# Altium schematic symbol library jlcpcb_2025_04_inductors_extended_0603.schlib: 1269 symbols (part 3 of 7) (continued)
## HSC0603-11NJ-T
designator L?  Inductance: 11nH
Inductor, 11nH, ±5%, 145mΩ, 700mA, SMD 0603; Manufacturer: EMTEK; Manufacturer Part Number: HSC0603-11NJ-T; Self-Resonant Frequency: 4GHz; Q Factor: 30@250MHz; Package Size: 0603; JLCPCB Basic Part: No; JLCPCB Part Number: C251765; Supplier 1: LCSC; Category: Inductors; Supplier Part Number 1: C251765; Tolerance: ±5%; Rated Current: 700mA; DC Resistance: 145mΩ; RoHS: Yes; ComponentLink1Description: Datasheet; ComponentLink1URL: https://wmsc.lcsc.com/wmsc/upload/file/pdf/v2/lcsc/2304140030_EMTEK-HSC0603-11NJ-T_C251765.pdf; ComponentLink2Description: JLCPCB Part URL; ComponentLink2URL: https://jlcpcb.com/partdetail/C251765; ComponentLink3Description: LCSC Part URL; ComponentLink3URL: https://lcsc.com/product-detail/Inductors-SMD_EMTEK-EMTEK-HSC0603-11NJ-T_C251765.html
footprint IND-0603 (0603 (1608M) Inductor)
pins: 1, 2

## HSC0603-16NJ-T
designator L?  Inductance: 16nH
Inductor, 16nH, ±5%, 170mΩ, 700mA, SMD 0603; Manufacturer: EMTEK; Manufacturer Part Number: HSC0603-16NJ-T; Self-Resonant Frequency: 3.3GHz; Q Factor: 34@250MHz; Package Size: 0603; JLCPCB Basic Part: No; JLCPCB Part Number: C251769; Supplier 1: LCSC; Category: Inductors; Supplier Part Number 1: C251769; Tolerance: ±5%; Rated Current: 700mA; DC Resistance: 170mΩ; RoHS: Yes; ComponentLink1Description: Datasheet; ComponentLink1URL: https://wmsc.lcsc.com/wmsc/upload/file/pdf/v2/lcsc/2304140030_EMTEK-HSC0603-16NJ-T_C251769.pdf; ComponentLink2Description: JLCPCB Part URL; ComponentLink2URL: https://jlcpcb.com/partdetail/C251769; ComponentLink3Description: LCSC Part URL; ComponentLink3URL: https://lcsc.com/product-detail/Inductors-SMD_EMTEK-EMTEK-HSC0603-16NJ-T_C251769.html
footprint IND-0603 (0603 (1608M) Inductor)
pins: 1, 2

## HSC0603-18NJ-T
designator L?  Inductance: 18nH
Inductor, 18nH, ±5%, 180mΩ, 700mA, SMD 0603; Manufacturer: EMTEK; Manufacturer Part Number: HSC0603-18NJ-T; Self-Resonant Frequency: 3.1GHz; Q Factor: 35@250MHz; Package Size: 0603; JLCPCB Basic Part: No; JLCPCB Part Number: C251770; Supplier 1: LCSC; Category: Inductors; Supplier Part Number 1: C251770; Tolerance: ±5%; Rated Current: 700mA; DC Resistance: 180mΩ; RoHS: Yes; ComponentLink1Description: Datasheet; ComponentLink1URL: https://wmsc.lcsc.com/wmsc/upload/file/pdf/v2/lcsc/2304140030_EMTEK-HSC0603-18NJ-T_C251770.pdf; ComponentLink2Description: JLCPCB Part URL; ComponentLink2URL: https://jlcpcb.com/partdetail/C251770; ComponentLink3Description: LCSC Part URL; ComponentLink3URL: https://lcsc.com/product-detail/Inductors-SMD_EMTEK-EMTEK-HSC0603-18NJ-T_C251770.html
footprint IND-0603 (0603 (1608M) Inductor)
pins: 1, 2

## HSC0603-20NJ-T
designator L?  Inductance: 20nH
Inductor, 20nH, ±5%, 190mΩ, 700mA, SMD 0603; Manufacturer: EMTEK; Manufacturer Part Number: HSC0603-20NJ-T; Self-Resonant Frequency: 3GHz; Q Factor: 38@250MHz; Package Size: 0603; JLCPCB Basic Part: No; JLCPCB Part Number: C251773; Supplier 1: LCSC; Category: Inductors; Supplier Part Number 1: C251773; Tolerance: ±5%; Rated Current: 700mA; DC Resistance: 190mΩ; RoHS: Yes; ComponentLink1Description: Datasheet; ComponentLink1URL: https://wmsc.lcsc.com/wmsc/upload/file/pdf/v2/lcsc/2304140030_EMTEK-HSC0603-20NJ-T_C251773.pdf; ComponentLink2Description: JLCPCB Part URL; ComponentLink2URL: https://jlcpcb.com/partdetail/C251773; ComponentLink3Description: LCSC Part URL; ComponentLink3URL: https://lcsc.com/product-detail/Inductors-SMD_EMTEK-EMTEK-HSC0603-20NJ-T_C251773.html
footprint IND-0603 (0603 (1608M) Inductor)
pins: 1, 2

## HSC0603-24NJ-T
designator L?  Inductance: 24nH
Inductor, 24nH, ±5%, 205mΩ, 700mA, SMD 0603; Manufacturer: EMTEK; Manufacturer Part Number: HSC0603-24NJ-T; Self-Resonant Frequency: 2.65GHz; Q Factor: 36@250MHz; Package Size: 0603; JLCPCB Basic Part: No; JLCPCB Part Number: C251775; Supplier 1: LCSC; Category: Inductors; Supplier Part Number 1: C251775; Tolerance: ±5%; Rated Current: 700mA; DC Resistance: 205mΩ; RoHS: Yes; ComponentLink1Description: Datasheet; ComponentLink1URL: https://wmsc.lcsc.com/wmsc/upload/file/pdf/v2/lcsc/2304140030_EMTEK-HSC0603-24NJ-T_C251775.pdf; ComponentLink2Description: JLCPCB Part URL; ComponentLink2URL: https://jlcpcb.com/partdetail/C251775; ComponentLink3Description: LCSC Part URL; ComponentLink3URL: https://lcsc.com/product-detail/Inductors-SMD_EMTEK-EMTEK-HSC0603-24NJ-T_C251775.html
footprint IND-0603 (0603 (1608M) Inductor)
pins: 1, 2

## HSC0603-27NJ-T
designator L?  Inductance: 27nH
Inductor, 27nH, ±5%, 220mΩ, 600mA, SMD 0603; Manufacturer: EMTEK; Manufacturer Part Number: HSC0603-27NJ-T; Self-Resonant Frequency: 2.8GHz; Q Factor: 40@250MHz; Package Size: 0603; JLCPCB Basic Part: No; JLCPCB Part Number: C251776; Supplier 1: LCSC; Category: Inductors; Supplier Part Number 1: C251776; Tolerance: ±5%; Rated Current: 600mA; DC Resistance: 220mΩ; RoHS: Yes; ComponentLink1Description: Datasheet; ComponentLink1URL: https://wmsc.lcsc.com/wmsc/upload/file/pdf/v2/lcsc/2304140030_EMTEK-HSC0603-27NJ-T_C251776.pdf; ComponentLink2Description: JLCPCB Part URL; ComponentLink2URL: https://jlcpcb.com/partdetail/C251776; ComponentLink3Description: LCSC Part URL; ComponentLink3URL: https://lcsc.com/product-detail/Inductors-SMD_EMTEK-EMTEK-HSC0603-27NJ-T_C251776.html
footprint IND-0603 (0603 (1608M) Inductor)
pins: 1, 2

## HSC0603-36NJ-T
designator L?  Inductance: 36nH
Inductor, 36nH, ±5%, 250mΩ, 600mA, SMD 0603; Manufacturer: EMTEK; Manufacturer Part Number: HSC0603-36NJ-T; Self-Resonant Frequency: 2.08GHz; Q Factor: 37@250MHz; Package Size: 0603; JLCPCB Basic Part: No; JLCPCB Part Number: C251780; Supplier 1: LCSC; Category: Inductors; Supplier Part Number 1: C251780; Tolerance: ±5%; Rated Current: 600mA; DC Resistance: 250mΩ; RoHS: Yes; ComponentLink1Description: Datasheet; ComponentLink1URL: https://wmsc.lcsc.com/wmsc/upload/file/pdf/v2/lcsc/2304140030_EMTEK-HSC0603-36NJ-T_C251780.pdf; ComponentLink2Description: JLCPCB Part URL; ComponentLink2URL: https://jlcpcb.com/partdetail/C251780; ComponentLink3Description: LCSC Part URL; ComponentLink3URL: https://lcsc.com/product-detail/Inductors-SMD_EMTEK-EMTEK-HSC0603-36NJ-T_C251780.html
footprint IND-0603 (0603 (1608M) Inductor)
pins: 1, 2

## HSC0603-39NJ-T
designator L?  Inductance: 39nH
Inductor, 39nH, ±5%, 260mΩ, 600mA, SMD 0603; Manufacturer: EMTEK; Manufacturer Part Number: HSC0603-39NJ-T; Self-Resonant Frequency: 2.2GHz; Q Factor: 40@250MHz; Package Size: 0603; JLCPCB Basic Part: No; JLCPCB Part Number: C251781; Supplier 1: LCSC; Category: Inductors; Supplier Part Number 1: C251781; Tolerance: ±5%; Rated Current: 600mA; DC Resistance: 260mΩ; RoHS: Yes; ComponentLink1Description: Datasheet; ComponentLink1URL: https://wmsc.lcsc.com/wmsc/upload/file/pdf/v2/lcsc/2304140030_EMTEK-HSC0603-39NJ-T_C251781.pdf; ComponentLink2Description: JLCPCB Part URL; ComponentLink2URL: https://jlcpcb.com/partdetail/C251781; ComponentLink3Description: LCSC Part URL; ComponentLink3URL: https://lcsc.com/product-detail/Inductors-SMD_EMTEK-EMTEK-HSC0603-39NJ-T_C251781.html
footprint IND-0603 (0603 (1608M) Inductor)
pins: 1, 2

## HSC0603-43NJ-T
designator L?  Inductance: 43nH
Inductor, 43nH, ±5%, 280mΩ, 600mA, SMD 0603; Manufacturer: EMTEK; Manufacturer Part Number: HSC0603-43NJ-T; Self-Resonant Frequency: 2GHz; Q Factor: 38@250MHz; Package Size: 0603; JLCPCB Basic Part: No; JLCPCB Part Number: C251785; Supplier 1: LCSC; Category: Inductors; Supplier Part Number 1: C251785; Tolerance: ±5%; Rated Current: 600mA; DC Resistance: 280mΩ; RoHS: Yes; ComponentLink1Description: Datasheet; ComponentLink1URL: https://wmsc.lcsc.com/wmsc/upload/file/pdf/v2/lcsc/2304140030_EMTEK-HSC0603-43NJ-T_C251785.pdf; ComponentLink2Description: JLCPCB Part URL; ComponentLink2URL: https://jlcpcb.com/partdetail/C251785; ComponentLink3Description: LCSC Part URL; ComponentLink3URL: https://lcsc.com/product-detail/Inductors-SMD_EMTEK-EMTEK-HSC0603-43NJ-T_C251785.html
footprint IND-0603 (0603 (1608M) Inductor)
pins: 1, 2

## HSC0603-51NJ-T
designator L?  Inductance: 51nH
Inductor, 51nH, ±5%, 300mΩ, 600mA, SMD 0603; Manufacturer: EMTEK; Manufacturer Part Number: HSC0603-51NJ-T; Self-Resonant Frequency: 2.13GHz; Q Factor: 38@250MHz; Package Size: 0603; JLCPCB Basic Part: No; JLCPCB Part Number: C251789; Supplier 1: LCSC; Category: Inductors; Supplier Part Number 1: C251789; Tolerance: ±5%; Rated Current: 600mA; DC Resistance: 300mΩ; RoHS: Yes; ComponentLink1Description: Datasheet; ComponentLink1URL: https://wmsc.lcsc.com/wmsc/upload/file/pdf/v2/lcsc/2304140030_EMTEK-HSC0603-51NJ-T_C251789.pdf; ComponentLink2Description: JLCPCB Part URL; ComponentLink2URL: https://jlcpcb.com/partdetail/C251789; ComponentLink3Description: LCSC Part URL; ComponentLink3URL: https://lcsc.com/product-detail/Inductors-SMD_EMTEK-EMTEK-HSC0603-51NJ-T_C251789.html
footprint IND-0603 (0603 (1608M) Inductor)
pins: 1, 2

## HSC0603-56NJ-T
designator L?  Inductance: 56nH
Inductor, 56nH, ±5%, 310mΩ, 600mA, SMD 0603; Manufacturer: EMTEK; Manufacturer Part Number: HSC0603-56NJ-T; Self-Resonant Frequency: 1.9GHz; Q Factor: 38@200MHz; Package Size: 0603; JLCPCB Basic Part: No; JLCPCB Part Number: C251790; Supplier 1: LCSC; Category: Inductors; Supplier Part Number 1: C251790; Tolerance: ±5%; Rated Current: 600mA; DC Resistance: 310mΩ; RoHS: Yes; ComponentLink1Description: Datasheet; ComponentLink1URL: https://wmsc.lcsc.com/wmsc/upload/file/pdf/v2/lcsc/2304140030_EMTEK-HSC0603-56NJ-T_C251790.pdf; ComponentLink2Description: JLCPCB Part URL; ComponentLink2URL: https://jlcpcb.com/partdetail/C251790; ComponentLink3Description: LCSC Part URL; ComponentLink3URL: https://lcsc.com/product-detail/Inductors-SMD_EMTEK-EMTEK-HSC0603-56NJ-T_C251790.html
footprint IND-0603 (0603 (1608M) Inductor)
pins: 1, 2

## HSC0603-72NJ-T
designator L?  Inductance: 72nH
Inductor, 72nH, ±5%, 490mΩ, 400mA, SMD 0603; Manufacturer: EMTEK; Manufacturer Part Number: HSC0603-72NJ-T; Self-Resonant Frequency: 1.7GHz; Q Factor: 34@150MHz; Package Size: 0603; JLCPCB Basic Part: No; JLCPCB Part Number: C251796; Supplier 1: LCSC; Category: Inductors; Supplier Part Number 1: C251796; Tolerance: ±5%; Rated Current: 400mA; DC Resistance: 490mΩ; RoHS: Yes; ComponentLink1Description: Datasheet; ComponentLink1URL: https://wmsc.lcsc.com/wmsc/upload/file/pdf/v2/lcsc/2304140030_EMTEK-HSC0603-72NJ-T_C251796.pdf; ComponentLink2Description: JLCPCB Part URL; ComponentLink2URL: https://jlcpcb.com/partdetail/C251796; ComponentLink3Description: LCSC Part URL; ComponentLink3URL: https://lcsc.com/product-detail/Inductors-SMD_EMTEK-EMTEK-HSC0603-72NJ-T_C251796.html
footprint IND-0603 (0603 (1608M) Inductor)
pins: 1, 2

## HSC0603-75NJ-T
designator L?  Inductance: 75nH
Inductor, 75nH, ±5%, 1A, SMD 0603; Manufacturer: EMTEK; Manufacturer Part Number: HSC0603-75NJ-T; Package Size: 0603; JLCPCB Basic Part: No; JLCPCB Part Number: C251797; Supplier 1: LCSC; Category: Inductors; Supplier Part Number 1: C251797; Tolerance: ±5%; Rated Current: 1A; RoHS: Yes; ComponentLink1Description: Datasheet; ComponentLink1URL: https://wmsc.lcsc.com/wmsc/upload/file/pdf/v2/lcsc/2304140030_EMTEK-HSC0603-75NJ-T_C251797.pdf; ComponentLink2Description: JLCPCB Part URL; ComponentLink2URL: https://jlcpcb.com/partdetail/C251797; ComponentLink3Description: LCSC Part URL; ComponentLink3URL: https://lcsc.com/product-detail/Inductors-SMD_EMTEK-EMTEK-HSC0603-75NJ-T_C251797.html
footprint IND-0603 (0603 (1608M) Inductor)
pins: 1, 2

## HSC0603-82NJ-T
designator L?  Inductance: 82nH
Inductor, 82nH, ±5%, 540mΩ, 400mA, SMD 0603; Manufacturer: EMTEK; Manufacturer Part Number: HSC0603-82NJ-T; Self-Resonant Frequency: 1.7GHz; Q Factor: 34@150MHz; Package Size: 0603; JLCPCB Basic Part: No; JLCPCB Part Number: C251799; Supplier 1: LCSC; Category: Inductors; Supplier Part Number 1: C251799; Tolerance: ±5%; Rated Current: 400mA; DC Resistance: 540mΩ; RoHS: Yes; ComponentLink1Description: Datasheet; ComponentLink1URL: https://wmsc.lcsc.com/wmsc/upload/file/pdf/v2/lcsc/2304140030_EMTEK-HSC0603-82NJ-T_C251799.pdf; ComponentLink2Description: JLCPCB Part URL; ComponentLink2URL: https://jlcpcb.com/partdetail/C251799; ComponentLink3Description: LCSC Part URL; ComponentLink3URL: https://lcsc.com/product-detail/Inductors-SMD_EMTEK-EMTEK-HSC0603-82NJ-T_C251799.html
footprint IND-0603 (0603 (1608M) Inductor)
pins: 1, 2

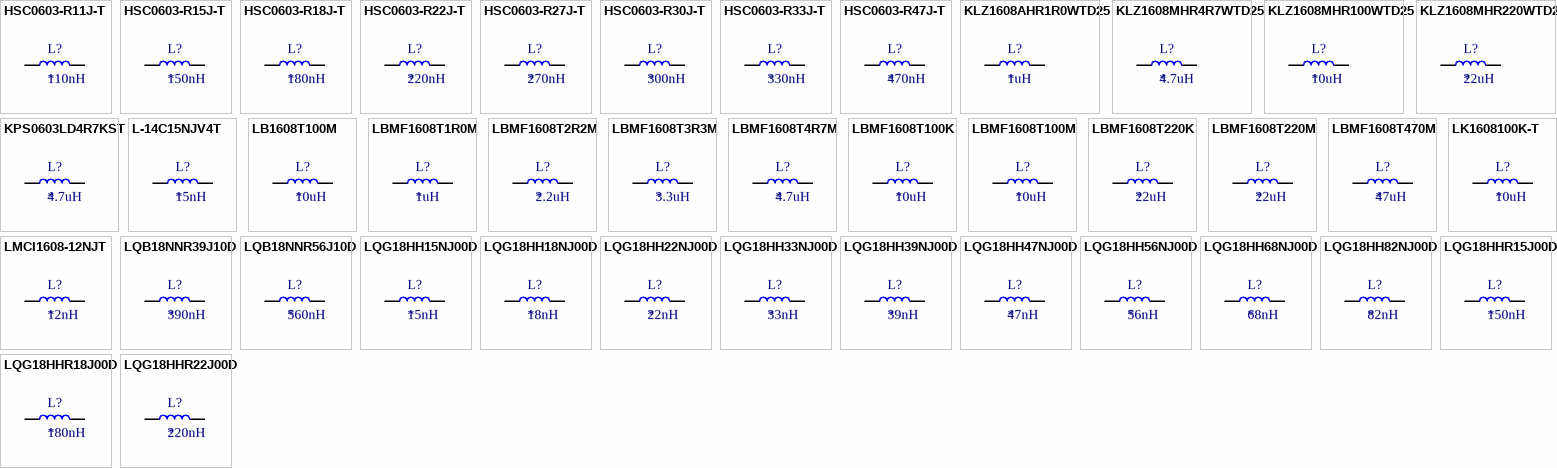
[diagram p11: symbols HSC0603-R11J-T to LQG18HHR22J00D]

## HSC0603-R11J-T
designator L?  Inductance: 110nH
Inductor, 110nH, ±5%, 610mΩ, 300mA, SMD 0603; Manufacturer: EMTEK; Manufacturer Part Number: HSC0603-R11J-T; Self-Resonant Frequency: 1.35GHz; Q Factor: 32@150MHz; Package Size: 0603; JLCPCB Basic Part: No; JLCPCB Part Number: C251805; Supplier 1: LCSC; Category: Inductors; Supplier Part Number 1: C251805; Tolerance: ±5%; Rated Current: 300mA; DC Resistance: 610mΩ; RoHS: Yes; ComponentLink1Description: Datasheet; ComponentLink1URL: https://wmsc.lcsc.com/wmsc/upload/file/pdf/v2/lcsc/2304140030_EMTEK-HSC0603-R11J-T_C251805.pdf; ComponentLink2Description: JLCPCB Part URL; ComponentLink2URL: https://jlcpcb.com/partdetail/C251805; ComponentLink3Description: LCSC Part URL; ComponentLink3URL: https://lcsc.com/product-detail/Inductors-SMD_EMTEK-EMTEK-HSC0603-R11J-T_C251805.html
footprint IND-0603 (0603 (1608M) Inductor)
pins: 1, 2

## HSC0603-R15J-T
designator L?  Inductance: 150nH
Inductor, 150nH, ±5%, 920mΩ, 280mA, SMD 0603; Manufacturer: EMTEK; Manufacturer Part Number: HSC0603-R15J-T; Self-Resonant Frequency: 990MHz; Q Factor: 28@150MHz; Package Size: 0603; JLCPCB Basic Part: No; JLCPCB Part Number: C251807; Supplier 1: LCSC; Category: Inductors; Supplier Part Number 1: C251807; Tolerance: ±5%; Rated Current: 280mA; DC Resistance: 920mΩ; RoHS: Yes; ComponentLink1Description: Datasheet; ComponentLink1URL: https://wmsc.lcsc.com/wmsc/upload/file/pdf/v2/lcsc/2304140030_EMTEK-HSC0603-R15J-T_C251807.pdf; ComponentLink2Description: JLCPCB Part URL; ComponentLink2URL: https://jlcpcb.com/partdetail/C251807; ComponentLink3Description: LCSC Part URL; ComponentLink3URL: https://lcsc.com/product-detail/Inductors-SMD_EMTEK-EMTEK-HSC0603-R15J-T_C251807.html
footprint IND-0603 (0603 (1608M) Inductor)
pins: 1, 2

## HSC0603-R18J-T
designator L?  Inductance: 180nH
Inductor, 180nH, ±5%, 1.25Ω, 240mA, SMD 0603; Manufacturer: EMTEK; Manufacturer Part Number: HSC0603-R18J-T; Self-Resonant Frequency: 990MHz; Q Factor: 25@100MHz; Package Size: 0603; JLCPCB Basic Part: No; JLCPCB Part Number: C251808; Supplier 1: LCSC; Category: Inductors; Supplier Part Number 1: C251808; Tolerance: ±5%; Rated Current: 240mA; DC Resistance: 1.25Ω; RoHS: Yes; ComponentLink1Description: Datasheet; ComponentLink1URL: https://wmsc.lcsc.com/wmsc/upload/file/pdf/v2/lcsc/2304140030_EMTEK-HSC0603-R18J-T_C251808.pdf; ComponentLink2Description: JLCPCB Part URL; ComponentLink2URL: https://jlcpcb.com/partdetail/C251808; ComponentLink3Description: LCSC Part URL; ComponentLink3URL: https://lcsc.com/product-detail/Inductors-SMD_EMTEK-EMTEK-HSC0603-R18J-T_C251808.html
footprint IND-0603 (0603 (1608M) Inductor)
pins: 1, 2

## HSC0603-R22J-T
designator L?  Inductance: 220nH
Inductor, 220nH, ±5%, 1.6Ω, 250mA, SMD 0603; Manufacturer: EMTEK; Manufacturer Part Number: HSC0603-R22J-T; Self-Resonant Frequency: 900MHz; Q Factor: 25@100MHz; Package Size: 0603; JLCPCB Basic Part: No; JLCPCB Part Number: C251809; Supplier 1: LCSC; Category: Inductors; Supplier Part Number 1: C251809; Tolerance: ±5%; Rated Current: 250mA; DC Resistance: 1.6Ω; RoHS: Yes; ComponentLink1Description: Datasheet; ComponentLink1URL: https://wmsc.lcsc.com/wmsc/upload/file/pdf/v2/lcsc/2304140030_EMTEK-HSC0603-R22J-T_C251809.pdf; ComponentLink2Description: JLCPCB Part URL; ComponentLink2URL: https://jlcpcb.com/partdetail/C251809; ComponentLink3Description: LCSC Part URL; ComponentLink3URL: https://lcsc.com/product-detail/Inductors-SMD_EMTEK-EMTEK-HSC0603-R22J-T_C251809.html
footprint IND-0603 (0603 (1608M) Inductor)
pins: 1, 2

## HSC0603-R27J-T
designator L?  Inductance: 270nH
Inductor, 270nH, ±5%, 2Ω, 170mA, SMD 0603; Manufacturer: EMTEK; Manufacturer Part Number: HSC0603-R27J-T; Self-Resonant Frequency: 900MHz; Q Factor: 24@100MHz; Package Size: 0603; JLCPCB Basic Part: No; JLCPCB Part Number: C251811; Supplier 1: LCSC; Category: Inductors; Supplier Part Number 1: C251811; Tolerance: ±5%; Rated Current: 170mA; DC Resistance: 2Ω; RoHS: Yes; ComponentLink1Description: Datasheet; ComponentLink1URL: https://wmsc.lcsc.com/wmsc/upload/file/pdf/v2/lcsc/2304140030_EMTEK-HSC0603-R27J-T_C251811.pdf; ComponentLink2Description: JLCPCB Part URL; ComponentLink2URL: https://jlcpcb.com/partdetail/C251811; ComponentLink3Description: LCSC Part URL; ComponentLink3URL: https://lcsc.com/product-detail/Inductors-SMD_EMTEK-EMTEK-HSC0603-R27J-T_C251811.html
footprint IND-0603 (0603 (1608M) Inductor)
pins: 1, 2

## HSC0603-R30J-T
designator L?  Inductance: 300nH
Inductor, 300nH, ±5%, 150mA, SMD 0603; Manufacturer: EMTEK; Manufacturer Part Number: HSC0603-R30J-T; Package Size: 0603; JLCPCB Basic Part: No; JLCPCB Part Number: C251812; Supplier 1: LCSC; Category: Inductors; Supplier Part Number 1: C251812; Tolerance: ±5%; Rated Current: 150mA; RoHS: Yes; ComponentLink1Description: Datasheet; ComponentLink1URL: https://wmsc.lcsc.com/wmsc/upload/file/pdf/v2/lcsc/1809301219_EMTEK-HSC0603-R30J-T_C251812.pdf; ComponentLink2Description: JLCPCB Part URL; ComponentLink2URL: https://jlcpcb.com/partdetail/C251812; ComponentLink3Description: LCSC Part URL; ComponentLink3URL: https://lcsc.com/product-detail/Inductors-SMD_EMTEK-EMTEK-HSC0603-R30J-T_C251812.html
footprint IND-0603 (0603 (1608M) Inductor)
pins: 1, 2

## HSC0603-R33J-T
designator L?  Inductance: 330nH
Inductor, 330nH, ±5%, 2.75Ω, 100mA, SMD 0603; Manufacturer: EMTEK; Manufacturer Part Number: HSC0603-R33J-T; Self-Resonant Frequency: 900MHz; Q Factor: 25@100MHz; Package Size: 0603; JLCPCB Basic Part: No; JLCPCB Part Number: C251813; Supplier 1: LCSC; Category: Inductors; Supplier Part Number 1: C251813; Tolerance: ±5%; Rated Current: 100mA; DC Resistance: 2.75Ω; RoHS: Yes; ComponentLink1Description: Datasheet; ComponentLink1URL: https://wmsc.lcsc.com/wmsc/upload/file/pdf/v2/lcsc/2304140030_EMTEK-HSC0603-R33J-T_C251813.pdf; ComponentLink2Description: JLCPCB Part URL; ComponentLink2URL: https://jlcpcb.com/partdetail/C251813; ComponentLink3Description: LCSC Part URL; ComponentLink3URL: https://lcsc.com/product-detail/Inductors-SMD_EMTEK-EMTEK-HSC0603-R33J-T_C251813.html
footprint IND-0603 (0603 (1608M) Inductor)
pins: 1, 2

## HSC0603-R47J-T
designator L?  Inductance: 470nH
Inductor, 470nH, ±5%, 4Ω, 80mA, SMD 0603; Manufacturer: EMTEK; Manufacturer Part Number: HSC0603-R47J-T; Self-Resonant Frequency: 750MHz; Q Factor: 25@100MHz; Package Size: 0603; JLCPCB Basic Part: No; JLCPCB Part Number: C251815; Supplier 1: LCSC; Category: Inductors; Supplier Part Number 1: C251815; Tolerance: ±5%; Rated Current: 80mA; DC Resistance: 4Ω; RoHS: Yes; ComponentLink1Description: Datasheet; ComponentLink1URL: https://wmsc.lcsc.com/wmsc/upload/file/pdf/v2/lcsc/1809301219_EMTEK-HSC0603-R47J-T_C251815.pdf; ComponentLink2Description: JLCPCB Part URL; ComponentLink2URL: https://jlcpcb.com/partdetail/C251815; ComponentLink3Description: LCSC Part URL; ComponentLink3URL: https://lcsc.com/product-detail/Inductors-SMD_EMTEK-EMTEK-HSC0603-R47J-T_C251815.html
footprint IND-0603 (0603 (1608M) Inductor)
pins: 1, 2

## KLZ1608AHR1R0WTD25
designator L?  Inductance: 1uH
Inductor, 1uH, ±20%, 150mΩ, 190mA, SMD 0603; Manufacturer: TDK; Manufacturer Part Number: KLZ1608AHR1R0WTD25; Package Size: 0603; JLCPCB Basic Part: No; JLCPCB Part Number: C404379; Supplier 1: LCSC; Category: Inductors; Supplier Part Number 1: C404379; Tolerance: ±20%; Rated Current: 190mA; Saturation Current: 190mA; DC Resistance: 150mΩ; RoHS: Yes; ComponentLink1Description: Datasheet; ComponentLink1URL: https://wmsc.lcsc.com/wmsc/upload/file/pdf/v2/lcsc/2304140030_TDK-KLZ1608AHR1R0WTD25_C404379.pdf; ComponentLink2Description: JLCPCB Part URL; ComponentLink2URL: https://jlcpcb.com/partdetail/C404379; ComponentLink3Description: LCSC Part URL; ComponentLink3URL: https://lcsc.com/product-detail/Inductors-SMD_TDK-TDK-KLZ1608AHR1R0WTD25_C404379.html
footprint IND-0603 (0603 (1608M) Inductor)
pins: 1, 2

## KLZ1608MHR4R7WTD25
designator L?  Inductance: 4.7uH
Inductor, 4.7uH, ±20%, 650mΩ, 350mA, SMD 0603; Manufacturer: TDK; Manufacturer Part Number: KLZ1608MHR4R7WTD25; Saturation Current: 120mA; Package Size: 0603; JLCPCB Basic Part: No; JLCPCB Part Number: C2042012; Supplier 1: LCSC; Category: Inductors; Supplier Part Number 1: C2042012; Tolerance: ±20%; Rated Current: 350mA; DC Resistance: 650mΩ; RoHS: Yes; ComponentLink1Description: Datasheet; ComponentLink1URL: https://wmsc.lcsc.com/wmsc/upload/file/pdf/v2/lcsc/2202010000_TDK-KLZ1608MHR4R7WTD25_C2042012.pdf; ComponentLink2Description: JLCPCB Part URL; ComponentLink2URL: https://jlcpcb.com/partdetail/C2042012; ComponentLink3Description: LCSC Part URL; ComponentLink3URL: https://lcsc.com/product-detail/Inductors-SMD_TDK-TDK-KLZ1608MHR4R7WTD25_C2042012.html
footprint IND-0603 (0603 (1608M) Inductor)
pins: 1, 2

## KLZ1608MHR100WTD25
designator L?  Inductance: 10uH
Inductor, 10uH, ±20%, 1.365Ω, SMD 0603; Manufacturer: TDK; Manufacturer Part Number: KLZ1608MHR100WTD25; Saturation Current: 90mA; Package Size: 0603; JLCPCB Basic Part: No; JLCPCB Part Number: C2041650; Supplier 1: LCSC; Category: Inductors; Supplier Part Number 1: C2041650; Tolerance: ±20%; DC Resistance: 1.365Ω; RoHS: Yes; ComponentLink1Description: Datasheet; ComponentLink1URL: https://wmsc.lcsc.com/wmsc/upload/file/pdf/v2/lcsc/2304140030_TDK-KLZ1608MHR100WTD25_C2041650.pdf; ComponentLink2Description: JLCPCB Part URL; ComponentLink2URL: https://jlcpcb.com/partdetail/C2041650; ComponentLink3Description: LCSC Part URL; ComponentLink3URL: https://lcsc.com/product-detail/Inductors-SMD_TDK-TDK-KLZ1608MHR100WTD25_C2041650.html
footprint IND-0603 (0603 (1608M) Inductor)
pins: 1, 2

## KLZ1608MHR220WTD25
designator L?  Inductance: 22uH
Inductor, 22uH, ±20%, 3.12Ω, SMD 0603; Manufacturer: TDK; Manufacturer Part Number: KLZ1608MHR220WTD25; Saturation Current: 55mA; Package Size: 0603; JLCPCB Basic Part: No; JLCPCB Part Number: C2041591; Supplier 1: LCSC; Category: Inductors; Supplier Part Number 1: C2041591; Tolerance: ±20%; DC Resistance: 3.12Ω; RoHS: Yes; ComponentLink1Description: Datasheet; ComponentLink1URL: https://wmsc.lcsc.com/wmsc/upload/file/pdf/v2/lcsc/2304140030_TDK-KLZ1608MHR220WTD25_C2041591.pdf; ComponentLink2Description: JLCPCB Part URL; ComponentLink2URL: https://jlcpcb.com/partdetail/C2041591; ComponentLink3Description: LCSC Part URL; ComponentLink3URL: https://lcsc.com/product-detail/Inductors-SMD_TDK-TDK-KLZ1608MHR220WTD25_C2041591.html
footprint IND-0603 (0603 (1608M) Inductor)
pins: 1, 2

## KPS0603LD4R7KST
designator L?  Inductance: 4.7uH
Inductor, 4.7uH, ±10%, 1.26Ω, 400mA, SMD 0603; Manufacturer: Yanchuang; Manufacturer Part Number: KPS0603LD4R7KST; Package Size: 0603; JLCPCB Basic Part: No; JLCPCB Part Number: C494717; Supplier 1: LCSC; Category: Inductors; Supplier Part Number 1: C494717; Tolerance: ±10%; Rated Current: 400mA; DC Resistance: 1.26Ω; RoHS: Yes; ComponentLink1Description: Datasheet; ComponentLink1URL: https://wmsc.lcsc.com/wmsc/upload/file/pdf/v2/lcsc/2004071209_Yanchuang-KPS0603LD4R7KST_C494717.pdf; ComponentLink2Description: JLCPCB Part URL; ComponentLink2URL: https://jlcpcb.com/partdetail/C494717; ComponentLink3Description: LCSC Part URL; ComponentLink3URL: https://lcsc.com/product-detail/Inductors-SMD_Yanchuang-Yanchuang-KPS0603LD4R7KST_C494717.html
footprint IND-0603 (0603 (1608M) Inductor)
pins: 1, 2

## L-14C15NJV4T
designator L?  Inductance: 15nH
Inductor, 15nH, ±5%, 550mΩ, 300mA, SMD 0603; Manufacturer: Johanson Dielectrics; Manufacturer Part Number: L-14C15NJV4T; Self-Resonant Frequency: 23GHz; Q Factor: 12@100MHz; Package Size: 0603; JLCPCB Basic Part: No; JLCPCB Part Number: C2041452; Supplier 1: LCSC; Category: Inductors; Supplier Part Number 1: C2041452; Tolerance: ±5%; Rated Current: 300mA; DC Resistance: 550mΩ; RoHS: Yes; ComponentLink1Description: Datasheet; ComponentLink1URL: https://wmsc.lcsc.com/wmsc/upload/file/pdf/v2/lcsc/2304140030_Johanson-Dielectrics-L-14C15NJV4T_C2041452.pdf; ComponentLink2Description: JLCPCB Part URL; ComponentLink2URL: https://jlcpcb.com/partdetail/C2041452; ComponentLink3Description: LCSC Part URL; ComponentLink3URL: https://lcsc.com/product-detail/Inductors-SMD_Johanson-Dielectrics-Johanson-Dielectrics-L-14C15NJV4T_C2041452.html
footprint IND-0603 (0603 (1608M) Inductor)
pins: 1, 2

## LB1608T100M
designator L?  Inductance: 10uH
Inductor, 10uH, ±20%, 700mΩ, 60mA, SMD 0603; Manufacturer: Taiyo Yuden; Manufacturer Part Number: LB1608T100M; Self-Resonant Frequency: 2.52MHz; Package Size: 0603; JLCPCB Basic Part: No; JLCPCB Part Number: C223240; Supplier 1: LCSC; Category: Inductors; Supplier Part Number 1: C223240; Tolerance: ±20%; Rated Current: 60mA; DC Resistance: 700mΩ; RoHS: Yes; ComponentLink1Description: Datasheet; ComponentLink1URL: https://wmsc.lcsc.com/wmsc/upload/file/pdf/v2/lcsc/2304140030_Taiyo-Yuden-LB1608T100M_C223240.pdf; ComponentLink2Description: JLCPCB Part URL; ComponentLink2URL: https://jlcpcb.com/partdetail/C223240; ComponentLink3Description: LCSC Part URL; ComponentLink3URL: https://lcsc.com/product-detail/Inductors-SMD_Taiyo-Yuden-Taiyo-Yuden-LB1608T100M_C223240.html
footprint IND-0603 (0603 (1608M) Inductor)
pins: 1, 2

## LBMF1608T1R0M
designator L?  Inductance: 1uH
Inductor, 1uH, ±20%, 90mΩ, 230mA, SMD 0603; Manufacturer: Taiyo Yuden; Manufacturer Part Number: LBMF1608T1R0M; Self-Resonant Frequency: 7.96MHz; Package Size: 0603; JLCPCB Basic Part: No; JLCPCB Part Number: C90325; Supplier 1: LCSC; Category: Inductors; Supplier Part Number 1: C90325; Tolerance: ±20%; Rated Current: 230mA; DC Resistance: 90mΩ; RoHS: Yes; ComponentLink1Description: Datasheet; ComponentLink1URL: https://wmsc.lcsc.com/wmsc/upload/file/pdf/v2/lcsc/2304140030_Taiyo-Yuden-LBMF1608T1R0M_C90325.pdf; ComponentLink2Description: JLCPCB Part URL; ComponentLink2URL: https://jlcpcb.com/partdetail/C90325; ComponentLink3Description: LCSC Part URL; ComponentLink3URL: https://lcsc.com/product-detail/Inductors-SMD_Taiyo-Yuden-Taiyo-Yuden-LBMF1608T1R0M_C90325.html
footprint IND-0603 (0603 (1608M) Inductor)
pins: 1, 2

## LBMF1608T2R2M
designator L?  Inductance: 2.2uH
Inductor, 2.2uH, ±20%, 170mΩ, 160mA, SMD 0603; Manufacturer: Taiyo Yuden; Manufacturer Part Number: LBMF1608T2R2M; Package Size: 0603; JLCPCB Basic Part: No; JLCPCB Part Number: C90326; Supplier 1: LCSC; Category: Inductors; Supplier Part Number 1: C90326; Tolerance: ±20%; Rated Current: 160mA; DC Resistance: 170mΩ; RoHS: Yes; ComponentLink1Description: Datasheet; ComponentLink1URL: https://wmsc.lcsc.com/wmsc/upload/file/pdf/v2/lcsc/2304140030_Taiyo-Yuden-LBMF1608T2R2M_C90326.pdf; ComponentLink2Description: JLCPCB Part URL; ComponentLink2URL: https://jlcpcb.com/partdetail/C90326; ComponentLink3Description: LCSC Part URL; ComponentLink3URL: https://lcsc.com/product-detail/Inductors-SMD_Taiyo-Yuden-Taiyo-Yuden-LBMF1608T2R2M_C90326.html
footprint IND-0603 (0603 (1608M) Inductor)
pins: 1, 2

## LBMF1608T3R3M
designator L?  Inductance: 3.3uH
Inductor, 3.3uH, ±20%, 220mΩ, 130mA, SMD 0603; Manufacturer: Taiyo Yuden; Manufacturer Part Number: LBMF1608T3R3M; Package Size: 0603; JLCPCB Basic Part: No; JLCPCB Part Number: C223241; Supplier 1: LCSC; Category: Inductors; Supplier Part Number 1: C223241; Tolerance: ±20%; Rated Current: 130mA; DC Resistance: 220mΩ; RoHS: Yes; ComponentLink1Description: Datasheet; ComponentLink1URL: https://wmsc.lcsc.com/wmsc/upload/file/pdf/v2/lcsc/2304140030_Taiyo-Yuden-LBMF1608T3R3M_C223241.pdf; ComponentLink2Description: JLCPCB Part URL; ComponentLink2URL: https://jlcpcb.com/partdetail/C223241; ComponentLink3Description: LCSC Part URL; ComponentLink3URL: https://lcsc.com/product-detail/Inductors-SMD_Taiyo-Yuden-Taiyo-Yuden-LBMF1608T3R3M_C223241.html
footprint IND-0603 (0603 (1608M) Inductor)
pins: 1, 2

## LBMF1608T4R7M
designator L?  Inductance: 4.7uH
Inductor, 4.7uH, ±20%, 240mΩ, 110mA, SMD 0603; Manufacturer: Taiyo Yuden; Manufacturer Part Number: LBMF1608T4R7M; Self-Resonant Frequency: 7.96MHz; Package Size: 0603; JLCPCB Basic Part: No; JLCPCB Part Number: C90327; Supplier 1: LCSC; Category: Inductors; Supplier Part Number 1: C90327; Tolerance: ±20%; Rated Current: 110mA; DC Resistance: 240mΩ; RoHS: Yes; ComponentLink1Description: Datasheet; ComponentLink1URL: https://wmsc.lcsc.com/wmsc/upload/file/pdf/v2/lcsc/2304140030_Taiyo-Yuden-LBMF1608T4R7M_C90327.pdf; ComponentLink2Description: JLCPCB Part URL; ComponentLink2URL: https://jlcpcb.com/partdetail/C90327; ComponentLink3Description: LCSC Part URL; ComponentLink3URL: https://lcsc.com/product-detail/Inductors-SMD_Taiyo-Yuden-Taiyo-Yuden-LBMF1608T4R7M_C90327.html
footprint IND-0603 (0603 (1608M) Inductor)
pins: 1, 2

## LBMF1608T100K
designator L?  Inductance: 10uH
Inductor, 10uH, ±10%, 360mΩ, 80mA, SMD 0603; Manufacturer: Taiyo Yuden; Manufacturer Part Number: LBMF1608T100K; Self-Resonant Frequency: 2.52MHz; Package Size: 0603; JLCPCB Basic Part: No; JLCPCB Part Number: C87216; Supplier 1: LCSC; Category: Inductors; Supplier Part Number 1: C87216; Tolerance: ±10%; Rated Current: 80mA; DC Resistance: 360mΩ; RoHS: Yes; ComponentLink1Description: Datasheet; ComponentLink1URL: https://wmsc.lcsc.com/wmsc/upload/file/pdf/v2/lcsc/1811071031_Taiyo-Yuden-LBMF1608T100K_C87216.pdf; ComponentLink2Description: JLCPCB Part URL; ComponentLink2URL: https://jlcpcb.com/partdetail/C87216; ComponentLink3Description: LCSC Part URL; ComponentLink3URL: https://lcsc.com/product-detail/Inductors-SMD_Taiyo-Yuden-Taiyo-Yuden-LBMF1608T100K_C87216.html
footprint IND-0603 (0603 (1608M) Inductor)
pins: 1, 2

## LBMF1608T100M
designator L?  Inductance: 10uH
Inductor, 10uH, ±20%, 360mΩ, 80mA, SMD 0603; Manufacturer: Taiyo Yuden; Manufacturer Part Number: LBMF1608T100M; Package Size: 0603; JLCPCB Basic Part: No; JLCPCB Part Number: C86752; Supplier 1: LCSC; Category: Inductors; Supplier Part Number 1: C86752; Tolerance: ±20%; Rated Current: 80mA; DC Resistance: 360mΩ; RoHS: Yes; ComponentLink1Description: Datasheet; ComponentLink1URL: https://wmsc.lcsc.com/wmsc/upload/file/pdf/v2/lcsc/1810091433_Taiyo-Yuden-LBMF1608T100M_C86752.pdf; ComponentLink2Description: JLCPCB Part URL; ComponentLink2URL: https://jlcpcb.com/partdetail/C86752; ComponentLink3Description: LCSC Part URL; ComponentLink3URL: https://lcsc.com/product-detail/Inductors-SMD_Taiyo-Yuden-Taiyo-Yuden-LBMF1608T100M_C86752.html
footprint IND-0603 (0603 (1608M) Inductor)
pins: 1, 2

## LBMF1608T220K
designator L?  Inductance: 22uH
Inductor, 22uH, ±10%, 1Ω, 50mA, SMD 0603; Manufacturer: Taiyo Yuden; Manufacturer Part Number: LBMF1608T220K; Self-Resonant Frequency: 2.52MHz; Package Size: 0603; JLCPCB Basic Part: No; JLCPCB Part Number: C223243; Supplier 1: LCSC; Category: Inductors; Supplier Part Number 1: C223243; Tolerance: ±10%; Rated Current: 50mA; DC Resistance: 1Ω; RoHS: Yes; ComponentLink1Description: Datasheet; ComponentLink1URL: https://wmsc.lcsc.com/wmsc/upload/file/pdf/v2/lcsc/2304140030_Taiyo-Yuden-LBMF1608T220K_C223243.pdf; ComponentLink2Description: JLCPCB Part URL; ComponentLink2URL: https://jlcpcb.com/partdetail/C223243; ComponentLink3Description: LCSC Part URL; ComponentLink3URL: https://lcsc.com/product-detail/Inductors-SMD_Taiyo-Yuden-Taiyo-Yuden-LBMF1608T220K_C223243.html
footprint IND-0603 (0603 (1608M) Inductor)
pins: 1, 2

## LBMF1608T220M
designator L?  Inductance: 22uH
Inductor, 22uH, ±20%, 1Ω, 50mA, SMD 0603; Manufacturer: Taiyo Yuden; Manufacturer Part Number: LBMF1608T220M; Package Size: 0603; JLCPCB Basic Part: No; JLCPCB Part Number: C223242; Supplier 1: LCSC; Category: Inductors; Supplier Part Number 1: C223242; Tolerance: ±20%; Rated Current: 50mA; DC Resistance: 1Ω; RoHS: Yes; ComponentLink1Description: Datasheet; ComponentLink1URL: https://wmsc.lcsc.com/wmsc/upload/file/pdf/v2/lcsc/2304140030_Taiyo-Yuden-LBMF1608T220M_C223242.pdf; ComponentLink2Description: JLCPCB Part URL; ComponentLink2URL: https://jlcpcb.com/partdetail/C223242; ComponentLink3Description: LCSC Part URL; ComponentLink3URL: https://lcsc.com/product-detail/Inductors-SMD_Taiyo-Yuden-Taiyo-Yuden-LBMF1608T220M_C223242.html
footprint IND-0603 (0603 (1608M) Inductor)
pins: 1, 2

## LBMF1608T470M
designator L?  Inductance: 47uH
Inductor, 47uH, ±20%, 2.5Ω, 35mA, SMD 0603; Manufacturer: Taiyo Yuden; Manufacturer Part Number: LBMF1608T470M; Package Size: 0603; JLCPCB Basic Part: No; JLCPCB Part Number: C223244; Supplier 1: LCSC; Category: Inductors; Supplier Part Number 1: C223244; Tolerance: ±20%; Rated Current: 35mA; DC Resistance: 2.5Ω; RoHS: Yes; ComponentLink1Description: Datasheet; ComponentLink1URL: https://wmsc.lcsc.com/wmsc/upload/file/pdf/v2/lcsc/2304140030_Taiyo-Yuden-LBMF1608T470M_C223244.pdf; ComponentLink2Description: JLCPCB Part URL; ComponentLink2URL: https://jlcpcb.com/partdetail/C223244; ComponentLink3Description: LCSC Part URL; ComponentLink3URL: https://lcsc.com/product-detail/Inductors-SMD_Taiyo-Yuden-Taiyo-Yuden-LBMF1608T470M_C223244.html
footprint IND-0603 (0603 (1608M) Inductor)
pins: 1, 2

## LK1608100K-T
designator L?  Inductance: 10uH
Inductor, 10uH, ±10%, 1.7Ω, 10mA, SMD 0603; Manufacturer: Taiyo Yuden; Manufacturer Part Number: LK1608100K-T; Q Factor: 35@2MHz; Package Size: 0603; JLCPCB Basic Part: No; JLCPCB Part Number: C222652; Supplier 1: LCSC; Category: Inductors; Supplier Part Number 1: C222652; Tolerance: ±10%; Rated Current: 10mA; DC Resistance: 1.7Ω; RoHS: Yes; ComponentLink1Description: Datasheet; ComponentLink1URL: https://wmsc.lcsc.com/wmsc/upload/file/pdf/v2/lcsc/1810171820_Taiyo-Yuden-LK1608100K-T_C222652.pdf; ComponentLink2Description: JLCPCB Part URL; ComponentLink2URL: https://jlcpcb.com/partdetail/C222652; ComponentLink3Description: LCSC Part URL; ComponentLink3URL: https://lcsc.com/product-detail/Inductors-SMD_Taiyo-Yuden-Taiyo-Yuden-LK1608100K-T_C222652.html
footprint IND-0603 (0603 (1608M) Inductor)
pins: 1, 2

## LMCI1608-12NJT
designator L?  Inductance: 12nH
Inductor, 12nH, ±5%, 450mΩ, 300mA, SMD 0603; Manufacturer: Venkel; Manufacturer Part Number: LMCI1608-12NJT; Self-Resonant Frequency: 3GHz; Q Factor: 12@100MHz; Package Size: 0603; JLCPCB Basic Part: No; JLCPCB Part Number: C3911040; Supplier 1: LCSC; Category: Inductors; Supplier Part Number 1: C3911040; Tolerance: ±5%; Rated Current: 300mA; DC Resistance: 450mΩ; RoHS: Yes; ComponentLink1Description: Datasheet; ComponentLink1URL: https://wmsc.lcsc.com/wmsc/upload/file/pdf/v2/lcsc/2401181714_Venkel-LMCI1608-12NJT_C3911040.pdf; ComponentLink2Description: JLCPCB Part URL; ComponentLink2URL: https://jlcpcb.com/partdetail/C3911040; ComponentLink3Description: LCSC Part URL; ComponentLink3URL: https://lcsc.com/product-detail/Inductors-SMD_Venkel-Venkel-LMCI1608-12NJT_C3911040.html
footprint IND-0603 (0603 (1608M) Inductor)
pins: 1, 2

## LQB18NNR39J10D
designator L?  Inductance: 390nH
Inductor, 390nH, ±5%, 540mΩ, 450mA, SMD 0603; Manufacturer: Murata Electronics; Manufacturer Part Number: LQB18NNR39J10D; Self-Resonant Frequency: 80MHz; Q Factor: 10@25MHz; Package Size: 0603; JLCPCB Basic Part: No; JLCPCB Part Number: C913538; Supplier 1: LCSC; Category: Inductors; Supplier Part Number 1: C913538; Tolerance: ±5%; Rated Current: 450mA; DC Resistance: 540mΩ; RoHS: Yes; ComponentLink1Description: Datasheet; ComponentLink1URL: https://wmsc.lcsc.com/wmsc/upload/file/pdf/v2/lcsc/2201131300_Murata-Electronics-LQB18NNR39J10D_C913538.pdf; ComponentLink2Description: JLCPCB Part URL; ComponentLink2URL: https://jlcpcb.com/partdetail/C913538; ComponentLink3Description: LCSC Part URL; ComponentLink3URL: https://lcsc.com/product-detail/Inductors-SMD_Murata-Electronics-Murata-Electronics-LQB18NNR39J10D_C913538.html
footprint IND-0603 (0603 (1608M) Inductor)
pins: 1, 2

## LQB18NNR56J10D
designator L?  Inductance: 560nH
Inductor, 560nH, ±5%, 850mΩ, 300mA, SMD 0603; Manufacturer: Murata Electronics; Manufacturer Part Number: LQB18NNR56J10D; Q Factor: 25@25MHz; Package Size: 0603; JLCPCB Basic Part: No; JLCPCB Part Number: C162532; Supplier 1: LCSC; Category: Inductors; Supplier Part Number 1: C162532; Tolerance: ±5%; Rated Current: 300mA; DC Resistance: 850mΩ; RoHS: Yes; ComponentLink1Description: Datasheet; ComponentLink1URL: https://wmsc.lcsc.com/wmsc/upload/file/pdf/v2/lcsc/1810311132_Murata-Electronics-LQB18NNR56J10D_C162532.pdf; ComponentLink2Description: JLCPCB Part URL; ComponentLink2URL: https://jlcpcb.com/partdetail/C162532; ComponentLink3Description: LCSC Part URL; ComponentLink3URL: https://lcsc.com/product-detail/Inductors-SMD_Murata-Electronics-Murata-Electronics-LQB18NNR56J10D_C162532.html
footprint IND-0603 (0603 (1608M) Inductor)
pins: 1, 2

## LQG18HH15NJ00D
designator L?  Inductance: 15nH
Inductor, 15nH, ±5%, 350mΩ, 600mA, SMD 0603; Manufacturer: Murata Electronics; Manufacturer Part Number: LQG18HH15NJ00D; Self-Resonant Frequency: 1.8GHz; Q Factor: 12@100MHz; Package Size: 0603; JLCPCB Basic Part: No; JLCPCB Part Number: C1161673; Supplier 1: LCSC; Category: Inductors; Supplier Part Number 1: C1161673; Tolerance: ±5%; Rated Current: 600mA; DC Resistance: 350mΩ; RoHS: Yes; ComponentLink1Description: Datasheet; ComponentLink1URL: https://wmsc.lcsc.com/wmsc/upload/file/pdf/v2/lcsc/2304140030_Murata-Electronics-LQG18HH15NJ00D_C1161673.pdf; ComponentLink2Description: JLCPCB Part URL; ComponentLink2URL: https://jlcpcb.com/partdetail/C1161673; ComponentLink3Description: LCSC Part URL; ComponentLink3URL: https://lcsc.com/product-detail/Inductors-SMD_Murata-Electronics-Murata-Electronics-LQG18HH15NJ00D_C1161673.html
footprint IND-0603 (0603 (1608M) Inductor)
pins: 1, 2

## LQG18HH18NJ00D
designator L?  Inductance: 18nH
Inductor, 18nH, ±5%, 350mΩ, 600mA, SMD 0603; Manufacturer: Murata Electronics; Manufacturer Part Number: LQG18HH18NJ00D; Self-Resonant Frequency: 1.8GHz; Q Factor: 12@100MHz; Package Size: 0603; JLCPCB Basic Part: No; JLCPCB Part Number: C783280; Supplier 1: LCSC; Category: Inductors; Supplier Part Number 1: C783280; Tolerance: ±5%; Rated Current: 600mA; DC Resistance: 350mΩ; RoHS: Yes; ComponentLink1Description: Datasheet; ComponentLink1URL: https://wmsc.lcsc.com/wmsc/upload/file/pdf/v2/lcsc/2009151404_Murata-Electronics-LQG18HH18NJ00D_C783280.pdf; ComponentLink2Description: JLCPCB Part URL; ComponentLink2URL: https://jlcpcb.com/partdetail/C783280; ComponentLink3Description: LCSC Part URL; ComponentLink3URL: https://lcsc.com/product-detail/Inductors-SMD_Murata-Electronics-Murata-Electronics-LQG18HH18NJ00D_C783280.html
footprint IND-0603 (0603 (1608M) Inductor)
pins: 1, 2

## LQG18HH22NJ00D
designator L?  Inductance: 22nH
Inductor, 22nH, ±5%, 500mΩ, 300mA, SMD 0603; Manufacturer: Murata Electronics; Manufacturer Part Number: LQG18HH22NJ00D; Self-Resonant Frequency: 1.6GHz; Q Factor: 12@100MHz; Package Size: 0603; JLCPCB Basic Part: No; JLCPCB Part Number: C527612; Supplier 1: LCSC; Category: Inductors; Supplier Part Number 1: C527612; Tolerance: ±5%; Rated Current: 300mA; DC Resistance: 500mΩ; RoHS: Yes; ComponentLink1Description: Datasheet; ComponentLink1URL: https://wmsc.lcsc.com/wmsc/upload/file/pdf/v2/lcsc/2304140030_Murata-Electronics-LQG18HH22NJ00D_C527612.pdf; ComponentLink2Description: JLCPCB Part URL; ComponentLink2URL: https://jlcpcb.com/partdetail/C527612; ComponentLink3Description: LCSC Part URL; ComponentLink3URL: https://lcsc.com/product-detail/Inductors-SMD_Murata-Electronics-Murata-Electronics-LQG18HH22NJ00D_C527612.html
footprint IND-0603 (0603 (1608M) Inductor)
pins: 1, 2

## LQG18HH33NJ00D
designator L?  Inductance: 33nH
Inductor, 33nH, ±5%, 540mΩ, 500mA, SMD 0603; Manufacturer: Murata Electronics; Manufacturer Part Number: LQG18HH33NJ00D; Self-Resonant Frequency: 1.2GHz; Q Factor: 12@100MHz; Package Size: 0603; JLCPCB Basic Part: No; JLCPCB Part Number: C1337008; Supplier 1: LCSC; Category: Inductors; Supplier Part Number 1: C1337008; Tolerance: ±5%; Rated Current: 500mA; DC Resistance: 540mΩ; RoHS: Yes; ComponentLink1Description: Datasheet; ComponentLink1URL: https://wmsc.lcsc.com/wmsc/upload/file/pdf/v2/lcsc/2304140030_Murata-Electronics-LQG18HH33NJ00D_C1337008.pdf; ComponentLink2Description: JLCPCB Part URL; ComponentLink2URL: https://jlcpcb.com/partdetail/C1337008; ComponentLink3Description: LCSC Part URL; ComponentLink3URL: https://lcsc.com/product-detail/Inductors-SMD_Murata-Electronics-Murata-Electronics-LQG18HH33NJ00D_C1337008.html
footprint IND-0603 (0603 (1608M) Inductor)
pins: 1, 2

## LQG18HH39NJ00D
designator L?  Inductance: 39nH
Inductor, 39nH, ±5%, 600mΩ, 300mA, SMD 0603; Manufacturer: Murata Electronics; Manufacturer Part Number: LQG18HH39NJ00D; Self-Resonant Frequency: 1GHz; Q Factor: 12@100MHz; Package Size: 0603; JLCPCB Basic Part: No; JLCPCB Part Number: C492044; Supplier 1: LCSC; Category: Inductors; Supplier Part Number 1: C492044; Tolerance: ±5%; Rated Current: 300mA; DC Resistance: 600mΩ; RoHS: Yes; ComponentLink1Description: Datasheet; ComponentLink1URL: https://wmsc.lcsc.com/wmsc/upload/file/pdf/v2/lcsc/2304140030_Murata-Electronics-LQG18HH39NJ00D_C492044.pdf; ComponentLink2Description: JLCPCB Part URL; ComponentLink2URL: https://jlcpcb.com/partdetail/C492044; ComponentLink3Description: LCSC Part URL; ComponentLink3URL: https://lcsc.com/product-detail/Inductors-SMD_Murata-Electronics-Murata-Electronics-LQG18HH39NJ00D_C492044.html
footprint IND-0603 (0603 (1608M) Inductor)
pins: 1, 2

## LQG18HH47NJ00D
designator L?  Inductance: 47nH
Inductor, 47nH, ±5%, 700mΩ, 400mA, SMD 0603; Manufacturer: Murata Electronics; Manufacturer Part Number: LQG18HH47NJ00D; Self-Resonant Frequency: 900MHz; Q Factor: 12@100MHz; Package Size: 0603; JLCPCB Basic Part: No; JLCPCB Part Number: C524629; Supplier 1: LCSC; Category: Inductors; Supplier Part Number 1: C524629; Tolerance: ±5%; Rated Current: 400mA; DC Resistance: 700mΩ; RoHS: Yes; ComponentLink1Description: Datasheet; ComponentLink1URL: https://wmsc.lcsc.com/wmsc/upload/file/pdf/v2/lcsc/2304140030_Murata-Electronics-LQG18HH47NJ00D_C524629.pdf; ComponentLink2Description: JLCPCB Part URL; ComponentLink2URL: https://jlcpcb.com/partdetail/C524629; ComponentLink3Description: LCSC Part URL; ComponentLink3URL: https://lcsc.com/product-detail/Inductors-SMD_Murata-Electronics-Murata-Electronics-LQG18HH47NJ00D_C524629.html
footprint IND-0603 (0603 (1608M) Inductor)
pins: 1, 2

## LQG18HH56NJ00D
designator L?  Inductance: 56nH
Inductor, 56nH, ±5%, 700mΩ, 300mA, SMD 0603; Manufacturer: Murata Electronics; Manufacturer Part Number: LQG18HH56NJ00D; Self-Resonant Frequency: 800MHz; Q Factor: 12@100MHz; Package Size: 0603; JLCPCB Basic Part: No; JLCPCB Part Number: C527611; Supplier 1: LCSC; Category: Inductors; Supplier Part Number 1: C527611; Tolerance: ±5%; Rated Current: 300mA; DC Resistance: 700mΩ; RoHS: Yes; ComponentLink1Description: Datasheet; ComponentLink1URL: https://wmsc.lcsc.com/wmsc/upload/file/pdf/v2/lcsc/2304140030_Murata-Electronics-LQG18HH56NJ00D_C527611.pdf; ComponentLink2Description: JLCPCB Part URL; ComponentLink2URL: https://jlcpcb.com/partdetail/C527611; ComponentLink3Description: LCSC Part URL; ComponentLink3URL: https://lcsc.com/product-detail/Inductors-SMD_Murata-Electronics-Murata-Electronics-LQG18HH56NJ00D_C527611.html
footprint IND-0603 (0603 (1608M) Inductor)
pins: 1, 2

## LQG18HH68NJ00D
designator L?  Inductance: 68nH
Inductor, 68nH, ±5%, 800mΩ, 400mA, SMD 0603; Manufacturer: Murata Electronics; Manufacturer Part Number: LQG18HH68NJ00D; Self-Resonant Frequency: 800MHz; Q Factor: 12@100MHz; Package Size: 0603; JLCPCB Basic Part: No; JLCPCB Part Number: C882498; Supplier 1: LCSC; Category: Inductors; Supplier Part Number 1: C882498; Tolerance: ±5%; Rated Current: 400mA; DC Resistance: 800mΩ; RoHS: Yes; ComponentLink1Description: Datasheet; ComponentLink1URL: https://wmsc.lcsc.com/wmsc/upload/file/pdf/v2/lcsc/2201242130_Murata-Electronics-LQG18HH68NJ00D_C882498.pdf; ComponentLink2Description: JLCPCB Part URL; ComponentLink2URL: https://jlcpcb.com/partdetail/C882498; ComponentLink3Description: LCSC Part URL; ComponentLink3URL: https://lcsc.com/product-detail/Inductors-SMD_Murata-Electronics-Murata-Electronics-LQG18HH68NJ00D_C882498.html
footprint IND-0603 (0603 (1608M) Inductor)
pins: 1, 2
